# Altium footprint library myPcb.PcbLib: 80 footprints (part 1 of 5)
Each footprint in its own frame and in the unit in brackets; x right, y up, seen from the top. Pads: shape width x height; smd on the part's side, far side on the other; paste and mask are expansions set on the pad; w line width, h text height; cw(c..) or ccw(c..) is an arc to the next point about the centre after c.
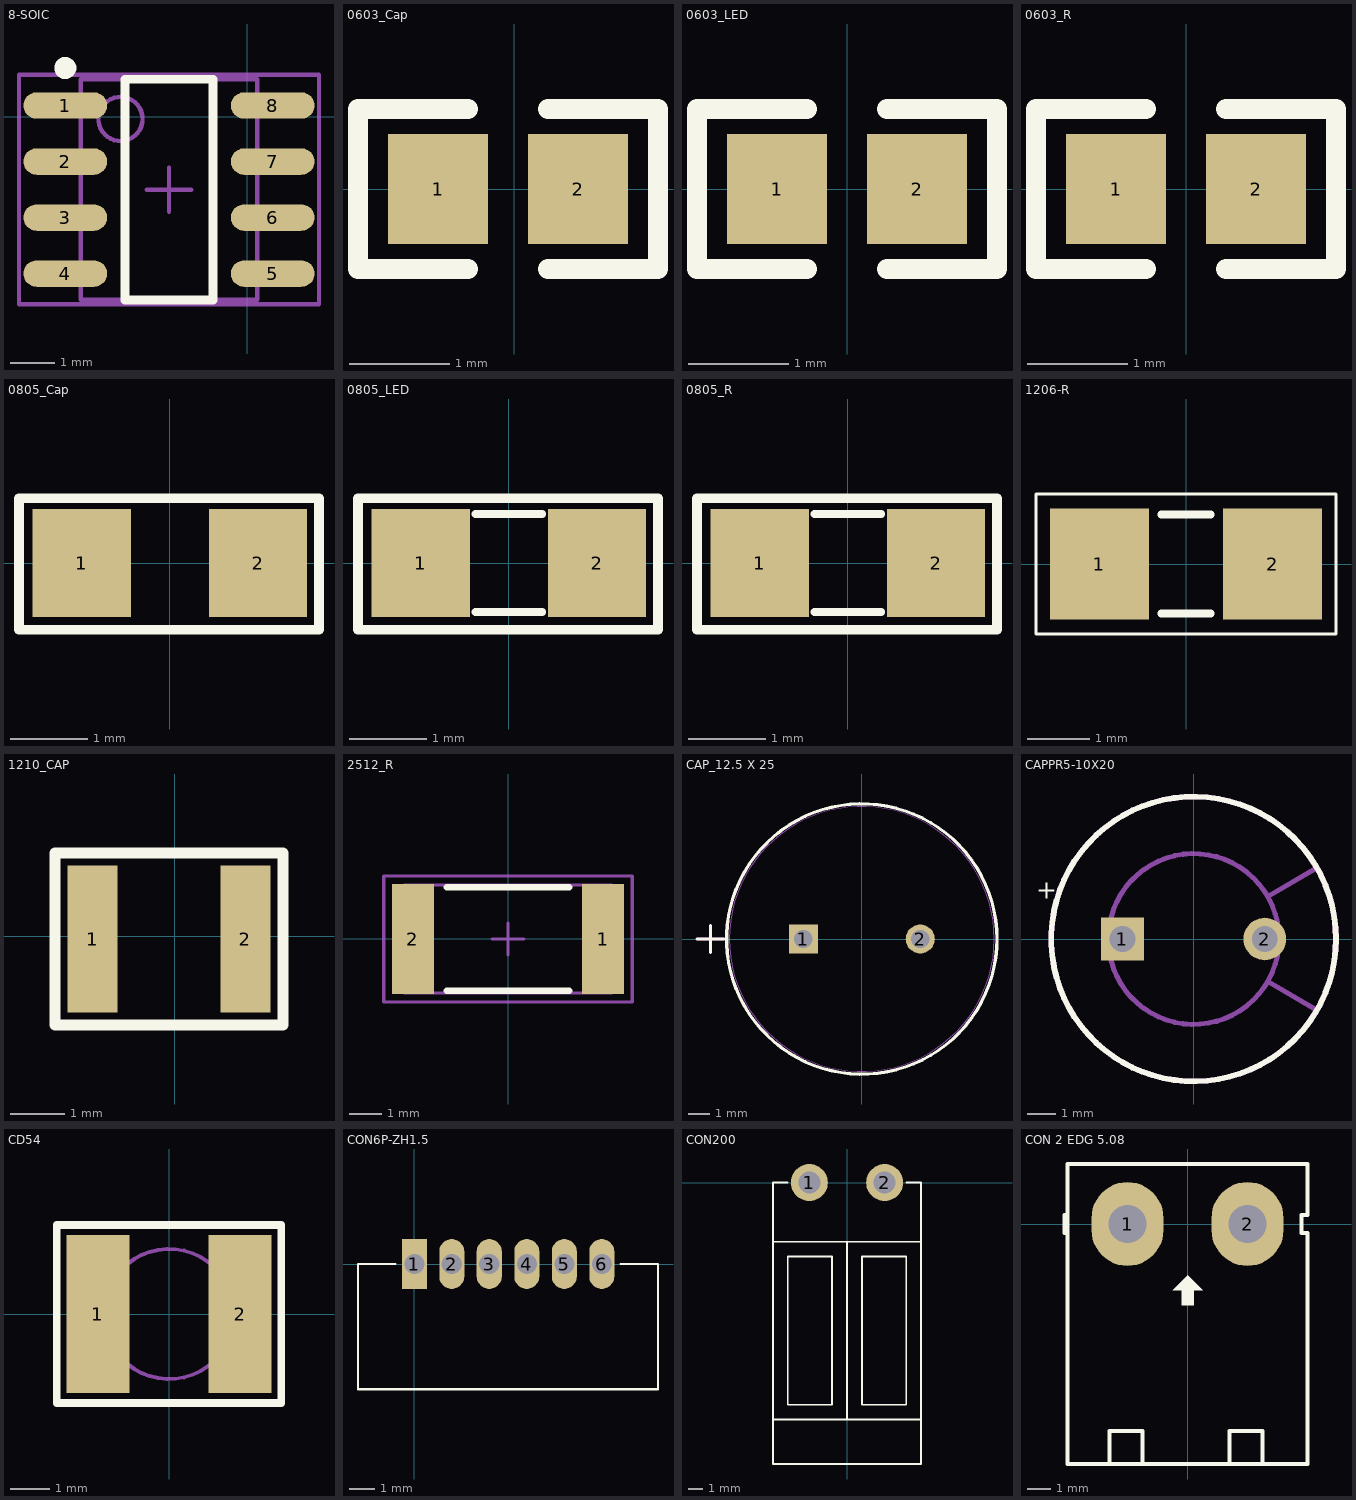
[diagram p0: the footprints below, top view; thin cyan lines are the x and y axes]

## 8-SOIC [mm]
pads (8):
  oval 1.9x0.6 smd: 1(-4.128,0.254) 2(-4.128,-1.016) 3(-4.128,-2.286) 4(-4.128,-3.556) 5(0.572,-3.556) 6(0.572,-2.286) 7(0.572,-1.016) 8(0.572,0.254)
Top Overlay:
  circle w0.25: c-4.128,1.104 r0.125
  lines w0.2: -2.778,-4.151 -0.778,-4.151 -0.778,0.849 -2.778,0.849 -2.778,-4.151
Mechanical 13:
  circle w0.1: c-2.878,-0.051 r0.5
  lines w0.1: -3.778,-4.151 0.222,-4.151 0.222,0.849 -3.778,0.849 -3.778,-4.151
Mechanical 15:
  lines w0.1: -2.278,-1.651 -1.278,-1.651 ; -1.778,-2.151 -1.778,-1.151 ; -5.178,-4.251 1.622,-4.251 1.622,0.949 -5.178,0.949 -5.178,-4.251
3D body: height 1.75, standoff 0, extent -3.778,-4.151 0.222,0.849

## 0603_Cap [mm]
pads (2):
  rect 1x1.1 smd: 1(-0.762,0) 2(0.638,0)
Top Overlay:
  lines w0.2: -0.462,-0.8 -1.562,-0.8 -1.562,-0.2 -1.562,0.8 -0.462,0.8 ; 0.338,-0.8 1.438,-0.8 1.438,0.8 0.338,0.8
3D body: height 0.8, standoff 0, extent -0.876,-0.4 0.724,0.4

## 0603_LED [mm]
pads (2):
  rect 1x1.1 smd: 1(-0.7,0) 2(0.7,0)
Top Overlay:
  lines w0.2: -0.4,-0.8 -1.5,-0.8 -1.5,-0.2 -1.5,0.8 -0.4,0.8 ; 0.4,-0.8 1.5,-0.8 1.5,0.8 0.4,0.8
3D body: height 1.1, standoff 0, extent -1.085,-0.644 0.935,0.606

## 0603_R [mm]
pads (2):
  rect 1x1.1 smd: 1(-0.7,0) 2(0.7,0)
Top Overlay:
  lines w0.2: -0.4,-0.8 -1.5,-0.8 -1.5,-0.2 -1.5,0.8 -0.4,0.8 ; 0.4,-0.8 1.5,-0.8 1.5,0.8 0.4,0.8
3D body: height 0.45, standoff 0, extent -0.789,-0.381 0.811,0.419

## 0805_Cap [mil]
height 50
pads (2):
  rect 50x55 smd: 1(-45,0) 2(45,0)
Top Overlay:
  lines w5: -77,-34 -77,33 76,33 76,-34 -77,-34
3D body: height 31.69, standoff -0.02, extent -57.11,-24.6 53.12,24.61

## 0805_LED [mil]
pads (2):
  rect 50x55 smd: 1(-45,0) 2(45,0)
Top Overlay:
  lines w4: -17,-25 17,-25 ; -17,25 17,25
  lines w5: -77,-34 76,-34 76,33 -77,33 -77,-34
3D body: height 43.31, standoff 0, extent -42.72,-25.36 36.81,23.85

## 0805_R [mil]
pads (2):
  rect 50x55 smd: 1(-45,0) 2(45,0)
Top Overlay:
  lines w4: -17,-25 17,-25 ; -17,25 17,25
  lines w5: -77,-34 -77,33 76,33 76,-34 -77,-34
3D body: height 28.43, standoff -1.49, extent -45.27,-26.57 45.28,26.58

## 1206-R [mm]
pads (2):
  rect 1.6x1.8 smd: 1(-1.4,0) 2(1.4,0)
Top Overlay:
  lines w0.051: -2.423,-1.133 -2.423,1.133 2.423,1.133 2.423,-1.133 -2.423,-1.133
  lines w0.127: -0.4,-0.8 0.4,-0.8 ; -0.4,0.8 0.4,0.8
3D body: height 0.56, standoff -0.04, extent -1.549,-0.8 1.651,0.8

## 1210_CAP [mil]
pads (2):
  rect 36x106 smd: 1(-59,-2) 2(51,-2)
Top Overlay:
  lines w7.87: -86,-64 -86,60 78,60 78,-64 -86,-64
3D body: height 90.55, standoff 0, extent -65.98,-50.21 60,48.22

## 2512_R [mm] "Chip Resistor, Body 6.3x3.2mm, IPC Medium Density"
height 0.71
pads (2):
  rect 1.3x3.4 smd: 1(2.95,0) 2(-2.95,0)
Top Overlay:
  lines w0.2: -1.9,-1.6 1.9,-1.6 ; -1.9,1.6 1.9,1.6
Mechanical 5:
  lines w0.1: -3.225,-1.675 -3.225,1.675 3.225,1.675 3.225,-1.675 -3.225,-1.675
Mechanical 13:
  lines w0.1: -2.463,-1.675 -2.463,1.675 ; 2.463,-1.675 2.463,1.675 ; -3.225,-1.675 -3.225,1.675 3.225,1.675 3.225,-1.675 -3.225,-1.675
Mechanical 15:
  lines w0.1: -0.5,0 0.5,0 ; 0,-0.5 0,0.5 ; -3.85,-1.95 -3.85,1.95 3.85,1.95 3.85,-1.95 -3.85,-1.95
3D body: height 0.6, standoff 0, extent -3.225,-1.574 3.175,1.626

## CAP_12.5 X 25 [mil]
pads (2):
  rect 54x54 hole 34 mask-1000: 1(-108.5,0)
  round 54 hole 34 mask-1000: 2(108.5,0)
Top Overlay:
  circle w6: c0,0 r251
  lines w6: -306,0 -256,0 ; -281,-25 -281,25
Top Paste:
  region: -135.5,-27 -81.5,-27 -81.5,27 -135.5,27
  region: 108.5,-27.23 115.55,-26.31 122.12,-23.58 127.76,-19.26 132.08,-13.62 134.81,-7.05 135.73,0 134.81,7.05 132.08,13.62 127.76,19.26 122.12,23.58 115.55,26.31 108.5,27.23 101.45,26.31 94.88,23.58 89.24,19.26 84.92,13.62 82.19,7.05 81.27,0 82.19,-7.05 84.92,-13.62 89.24,-19.26 94.88,-23.58 101.45,-26.31
Top Solder:
  region: -135.5,-27 -81.5,-27 -81.5,27 -135.5,27
  region: 108.5,-27.23 115.55,-26.31 122.12,-23.58 127.76,-19.26 132.08,-13.62 134.81,-7.05 135.73,0 134.81,7.05 132.08,13.62 127.76,19.26 122.12,23.58 115.55,26.31 108.5,27.23 101.45,26.31 94.88,23.58 89.24,19.26 84.92,13.62 82.19,7.05 81.27,0 82.19,-7.05 84.92,-13.62 89.24,-19.26 94.88,-23.58 101.45,-26.31
Bottom Solder:
  region: -135.5,-27 -81.5,-27 -81.5,27 -135.5,27
  region: 108.5,-27.23 115.55,-26.31 122.12,-23.58 127.76,-19.26 132.08,-13.62 134.81,-7.05 135.73,0 134.81,7.05 132.08,13.62 127.76,19.26 122.12,23.58 115.55,26.31 108.5,27.23 101.45,26.31 94.88,23.58 89.24,19.26 84.92,13.62 82.19,7.05 81.27,0 82.19,-7.05 84.92,-13.62 89.24,-19.26 94.88,-23.58 101.45,-26.31
Mechanical 1:
  circle w1: c0,0 r246
  lines w1: -306,0 -256,0 ; -281,-25 -281,25
Mechanical 16:
  lines w6: -306,0 -256,0 ; -281,-25 -281,25
3D body: height 984.02, standoff -172.01, extent -245.98,-245.85 245.41,245.85

## CAPPR5-10X20 [mm] "Capacitor, Electrolytic, Radial; Body 10 x 20 mm (Dia.xH typ); Pin Spacing 5 mm (typ)"
height 22
pads (2):
  rect 1.5x1.5 hole 0.9: 1(-2.5,0)
  round 1.5 hole 0.9: 2(2.5,0)
Top Overlay:
  circle w0.2: c0,0 r5
  text "+" at -5.537,1.422 h0.64
Mechanical 5:
  circle w0.2: c0,0 r5
  text "+" at -3.759,-4.572 h0.64
Mechanical 13:
  circle w0.178: c2.5,0 r0.3
  circle w0.178: c-2.5,0 r0.3
  circle w0.178: c0,0 r3
  lines w0.178: 2.623,-1.5 4.33,-2.5 cw(c0,0) 4.33,2.5 ; 2.623,1.5 4.33,2.5
3D body: height 1, standoff -2.54, extent 2.195,-0.305 2.805,0.305
3D body: height 1, standoff -2.54, extent -2.805,-0.305 -2.195,0.305
3D body: height 22, standoff 0, extent -3.009,-3.009 3.009,3.009
3D body: height 22, standoff 0, extent -5.01,-5.01 4.339,5.01
3D body: height 22, standoff 0, extent 2.597,-2.506 5.011,2.506

## CD54 [mm]
pads (2):
  rect 1.6x4 smd: 1(-1.803,0) 2(1.803,0)
Top Overlay:
  lines w0.2: -2.845,-2.261 2.845,-2.261 2.845,2.261 -2.845,2.261 -2.845,-2.261
Mechanical 5:
  circle w0.1: c0,0 r1.65
3D body: height 2.8, standoff 2.4, extent -1.657,-1.657 1.657,1.657
3D body: height 2.4, standoff 0.8, extent -1.462,-1.487 1.462,1.437
3D body: height 0.8, standoff 0, extent -1.718,-1.648 1.597,1.667

## CON6P-ZH1.5 [mm] "CON6"
pads (6):
  rect 1x2 hole 0.8 paste+0: 1(0,0)
  oval 1x2 hole 0.8 paste+0: 2(1.5,0) 3(3,0) 4(4.5,0) 5(6,0) 6(7.5,0)
Top Overlay:
  lines w0.1: -0.75,0 -2.25,0 -2.25,-5 9.75,-5 9.75,0 8.25,0

## CON200 [mm]
pads (2):
  round 2.5 hole 1.5: 1(-2.54,0) 2(2.54,0)
Top Overlay:
  lines w0.127: -5,-16 5,-16 ; -5,-4 5,-4 ; -4,0 -5,0 -5,-19 5,-19 5,0 4,0 ; 0,-16 0,-4 ; -4,-15 -4,-5 -1,-5 -1,-15 -4,-15 ; 1,-15 4,-15 4,-5 1,-5 1,-15

## CON 2 EDG 5.08 [mil]
height 104.33
pads (2):
  oval 120x140 hole 62.99: 1(-100,0) 2(100,0)
Top Overlay:
  region: 0,-85 -25,-110 -10,-110 -10,-135 10,-135 10,-110 25,-110
  lines w7: -205,-15 -205,15 ; -200,77 -200,-400 200,-400 200,-15 190,-15 190,15 200,15 200,77 ; -200,100 200,100 ; -130,-400 -130,-345 -75,-345 -75,-400 ; 70,-400 70,-345 125,-345 125,-400
  lines w7.01: -200,77 -200,100 ; 200,76 200,100
3D body: height 333.51, standoff -157.48, extent -196.7,-399.22 197,73.22